# Altium footprint library THU VIEN PCB.PCBLib: 534 footprints (part 3 of 34)
Each footprint in its own frame and in the unit in brackets; x right, y up, seen from the top. Pads: shape width x height; smd on the part's side, far side on the other; paste and mask are expansions set on the pad; w line width, h text height; cw(c..) or ccw(c..) is an arc to the next point about the centre after c.
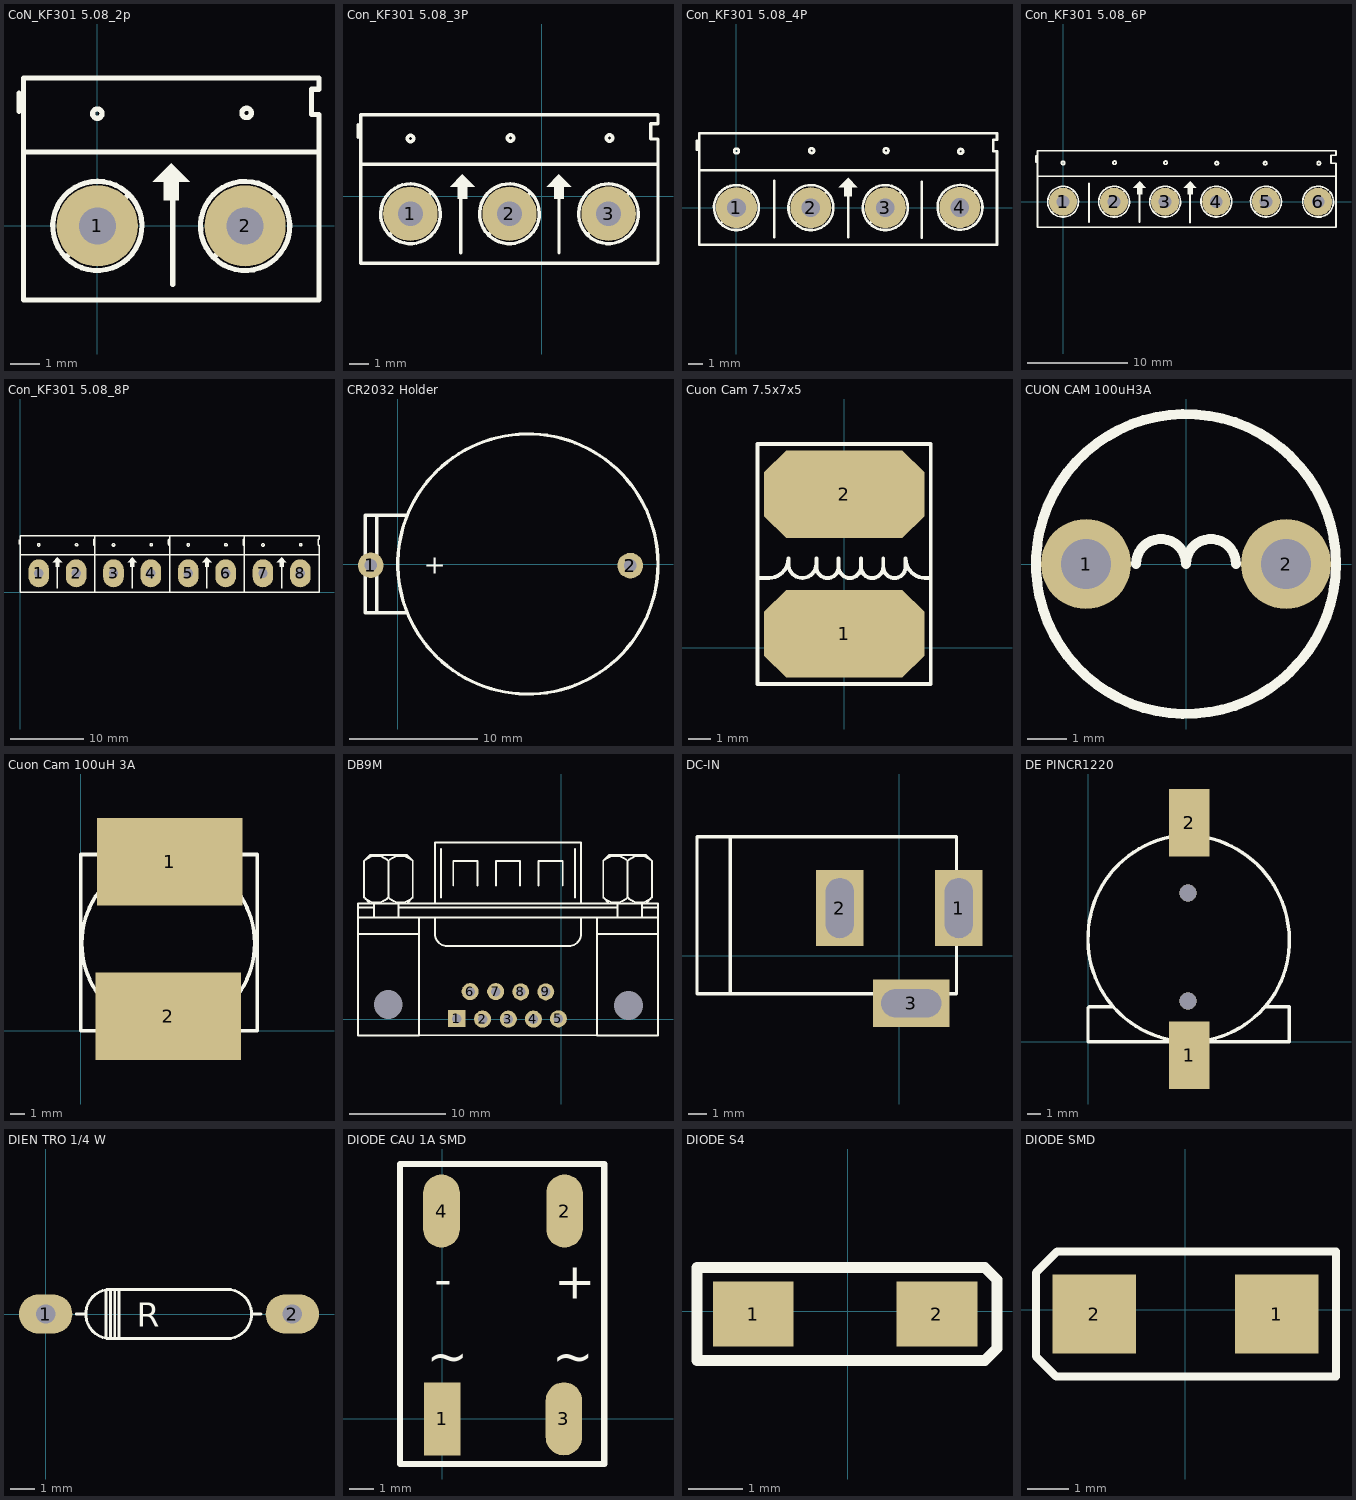
[diagram p2: the footprints below, top view; thin cyan lines are the x and y axes]

## CoN_KF301 5.08_2p [mil]
pads (2):
  round 110 hole 50: 1(0,0) 2(200,0)
Top Overlay:
  circle w7: c202,153 r6.4
  circle w7: c0,152 r6.4
  region: 100,85 75,60 90,60 90,35 110,35 110,60 125,60
  lines w7: -106,155 -106,180 ; -100,100 300,100 ; -42,-42 43,43 ; 39.04,46.05 ccw(c0,0) 45.18,40.05 ; 102,-79 102,72 ; 158,-42 242.5,42.5 ; 239.76,45.44 ccw(c200,0) 245.18,40.05 ; 290,182 290,151 300,151 300,-100 -100,-100 -100,50 -100,200 300,200 300,185 290,185 ; 300,-79 300,40
3D body "Con 2 KF301.stp": height 335.25, standoff -137.19, extent -45,-97.4 255,190

## Con_KF301 5.08_3P [mil]
pads (3):
  round 110 hole 50: 1(-265,-35) 2(-65,-35) 3(135.06,-34.94)
Top Overlay:
  circle w7: c137,118 r6.4
  circle w7: c-265,117 r6.4
  circle w7: c-63,118 r6.4
  region: -160,45 -185,20 -170,20 -170,-5 -150,-5 -150,20 -135,20
  region: 35,45 10,20 25,20 25,-5 45,-5 45,20 60,20
  lines w7: -371,120 -371,145 ; -365,65 230,65 ; -307,-77 -222,8 ; -225.96,11.05 ccw(c-265,-35) -219.82,5.05 ; -163,-114 -163,37 ; -107,-77 -22.5,7.5 ; -25.24,10.44 ccw(c-65,-35) -19.82,5.05 ; 35,-114 35,5 ; 93.5,-76.5 177.5,7.5 ; 174.27,10.97 ccw(c135.06,-34.94) 180.19,5.17 ; -365,-135 235,-135 235,116 220,116 220,147 235,147 235,165 -365,165 -365,15 -365,-135

## Con_KF301 5.08_4P [mil]
pads (4):
  round 110 hole 50: 1(0,0) 2(200,0) 3(400.06,0.06) 4(600.39,0.39)
Top Overlay:
  circle w7: c602.6,151 r6.4
  circle w7: c402,153 r6.4
  circle w7: c0,152 r6.4
  circle w7: c202,153 r6.4
  region: 300,80 275,55 290,55 290,30 310,30 310,55 325,55
  lines w7: -106,155 -106,180 ; -100,100 700,100 ; -42,-42 43,43 ; 39.04,46.05 ccw(c0,0) 45.18,40.05 ; 102,-79 102,72 ; 158,-42 242.5,42.5 ; 239.76,45.44 ccw(c200,0) 245.18,40.05 ; 300,-79 300,40 ; 358.5,-41.5 442.5,42.5 ; 439.27,45.97 ccw(c400.06,0.06) 445.19,40.17 ; 497.97,-81.03 497.97,69.97 ; 559,-41 643.5,43.5 ; 640.16,46.18 ccw(c600.59,0.59) 646.12,40.23 ; -100,-100 700,-100 700,151 690,151 690,182 700,182 700,200 -100,200 -100,50 -100,-100
3D body "terminal_blocks_a-tb500-ta04.stp": height 496.57, standoff -145.15, extent -115.51,-156 695.51,198.33

## Con_KF301 5.08_6P [mil]
pads (6):
  round 110 hole 50: 1(0,0) 2(200,0) 3(400.06,0.06) 4(600.39,0.39) 5(795.39,0.39) 6(1000,0)
Top Overlay:
  circle w7: c1002.6,151 r6.4
  circle w7: c792.6,151 r6.4
  circle w7: c202,153 r6.4
  circle w7: c0,152 r6.4
  circle w7: c402,153 r6.4
  circle w7: c602.6,151 r6.4
  region: 498,80 473,55 488,55 488,30 508,30 508,55 523,55
  region: 300,80 275,55 290,55 290,30 310,30 310,55 325,55
  lines w7: -106,155 -106,180 ; -100,100 1070,100 ; -42,-42 43,43 ; 39.04,46.05 ccw(c0,0) 45.18,40.05 ; 102,-79 102,72 ; 158,-42 242.5,42.5 ; 239.76,45.44 ccw(c200,0) 245.18,40.05 ; 300,-79 300,40 ; 358.5,-41.5 442.5,42.5 ; 439.27,45.97 ccw(c400.06,0.06) 445.19,40.17 ; 497.97,-81.03 497.97,69.97 ; 559,-41 643.5,43.5 ; 640.16,46.18 ccw(c600.59,0.59) 646.12,40.23 ; 754,-41 838.5,43.5 ; 835.16,46.18 ccw(c795.59,0.59) 841.12,40.23 ; 1039.57,45.6 ccw(c1000,0) 1045.53,39.65 ; -100,-100 -100,50 -100,200 1070,200 1070,182 1050,182 1050,151 1070,151 1070,-100 -100,-100
3D body "SW3dPS-KRM2.STEP": height 393.7, standoff -157.48, extent -96.85,-100 296.85,195.28
3D body "SW3dPS-KRM2.STEP": height 393.7, standoff -157.48, extent 293.15,-100 686.85,195.28
3D body "SW3dPS-KRM2.STEP": height 393.7, standoff -157.48, extent 683.15,-100 1076.85,195.28

## Con_KF301 5.08_8P [mm]
pads (8):
  oval 2.794x3.8 hole 1.27: 1(2.54,2.54) 2(7.62,2.54) 3(12.7,2.54) 4(17.78,2.54) 5(22.86,2.54) 6(27.94,2.54) 7(33.02,2.54) 8(38.1,2.54)
Top Overlay:
  circle w0.178: c33.02,6.401 r0.163
  circle w0.178: c38.151,6.426 r0.163
  circle w0.178: c27.991,6.426 r0.163
  circle w0.178: c22.86,6.401 r0.163
  circle w0.178: c17.831,6.426 r0.163
  circle w0.178: c12.7,6.401 r0.163
  circle w0.178: c7.671,6.426 r0.163
  circle w0.178: c2.54,6.401 r0.163
  region: 35.56,4.699 34.925,4.064 35.306,4.064 35.306,3.429 35.814,3.429 35.814,4.064 36.195,4.064
  region: 25.4,4.699 24.765,4.064 25.146,4.064 25.146,3.429 25.654,3.429 25.654,4.064 26.035,4.064
  region: 15.24,4.699 14.605,4.064 14.986,4.064 14.986,3.429 15.494,3.429 15.494,4.064 15.875,4.064
  region: 5.08,4.699 4.445,4.064 4.826,4.064 4.826,3.429 5.334,3.429 5.334,4.064 5.715,4.064
  lines w0.178: -0.152,6.477 -0.152,7.112 ; 0.051,5.08 10.135,5.08 ; 5.08,0.533 5.08,4.369 ; 10.008,6.477 10.008,7.112 ; 10.211,5.08 20.295,5.08 ; 15.24,0.533 15.24,4.369 ; 20.168,6.477 20.168,7.112 ; 20.371,5.08 30.455,5.08 ; 25.4,0.533 25.4,4.369 ; 30.328,6.477 30.328,7.112 ; 30.531,5.08 40.615,5.08 ; 35.56,0.533 35.56,4.369 ; 10.16,0 10.16,3.81 10.16,7.62 ; 10.16,0 20.32,0 ; 10.16,0 10.16,6.375 10.033,6.375 10.033,7.163 10.16,7.163 10.16,7.62 ; 10.16,0 0,0 0,3.81 0,7.62 10.16,7.62 ; 10.16,7.62 20.32,7.62 ; 20.32,0 20.32,3.81 20.32,7.62 ; 20.32,0 30.48,0 ; 20.32,0 20.32,6.375 20.193,6.375 20.193,7.163 20.32,7.163 20.32,7.62 ; 20.32,7.62 30.48,7.62 ; 30.48,0 40.64,0 40.64,6.375 40.513,6.375 40.513,7.163 40.64,7.163 40.64,7.62 30.48,7.62 ; 30.48,0 30.48,3.81 30.48,7.62 ; 30.48,0 30.48,6.375 30.353,6.375 30.353,7.163 30.48,7.163 30.48,7.62
3D body "SW3dPS-KRM2.STEP": height 10, standoff -4, extent 30.56,0.06 40.56,7.56
3D body "SW3dPS-KRM2.STEP": height 10, standoff -4, extent 20.4,0.06 30.4,7.56
3D body "SW3dPS-KRM2.STEP": height 10, standoff -4, extent 10.24,0.06 20.24,7.56
3D body "SW3dPS-KRM2.STEP": height 10, standoff -4, extent 0.08,0.06 10.08,7.56

## CR2032 Holder [mm]
pads (2):
  round 2 hole 1: 1(-2.108,-0.102) 2(18.161,-0.127)
Top Overlay:
  circle w0.254: c10.16,0 r10.161
  lines w0.254: -1.651,-3.81 -1.651,3.81 ; 0.635,-3.81 -2.54,-3.81 -2.54,3.81 0.635,3.81
  text "+" at 2.032,-0.762 h1.52
3D body "CR2032_HOR_HOLD.step": height 8.52, standoff -3.98, extent -3.213,-11.076 21.287,10.924

## Cuon Cam 7.5x7x5 [mm]
pads (2):
  oct 7.3x4 smd: 1(0,0.635) 2(0,6.985)
Top Overlay:
  lines w0.178: -3.937,3.175 -3.429,3.175 ccw(c-3.429,4.064) -2.54,4.064 -2.54,3.81 ccw(c-1.905,3.81) -1.905,3.175 ccw(c-1.905,3.81) -1.27,3.81 -1.27,4.064 -1.27,3.683 ccw(c-0.762,3.683) -0.762,3.175 ccw(c-0.762,3.683) -0.254,3.683 ; 3.937,3.175 3.683,3.175 cw(c3.683,4.064) 2.794,4.064 2.794,3.683 cw(c2.286,3.683) 2.286,3.175 cw(c2.286,3.683) 1.778,3.683 ; -0.254,3.683 ccw(c0.254,3.683) 0.254,3.175 ccw(c0.254,3.683) 0.762,3.683 ; -0.254,3.683 -0.254,4.064 -0.254,3.683 ; 0.762,3.683 ccw(c1.27,3.683) 1.27,3.175 ccw(c1.27,3.683) 1.778,3.683 ; 0.762,3.683 0.762,4.064 0.762,3.683 ; 1.778,3.683 1.778,4.064 1.778,3.683 ; -3.937,-1.651 -3.937,9.271 3.937,9.271 3.937,-1.651 -3.937,-1.651
3D body "cuon cam 75.step": height 5.02, standoff 0.01, extent -3.5,0.069 3.5,7.805

## CUON CAM 100uH3A [mil] "100uH3A"
pads (2):
  round 90 hole 50: 1(-100,0) 2(100,0)
Top Overlay:
  circle w10: c0,0 r150
  lines w10: -50,0 cw(c-25,0) 0,0 cw(c25,0) 50,0
3D body "cuon cam cam 1A.step": height 394.18, standoff -196.37, extent -171.27,-175.26 171.25,167.26

## Cuon Cam 100uH 3A [mm]
pads (2):
  rect 10x6 smd: 1(6.1,11.6) 2(6,1)
Top Overlay:
  circle w0.254: c6,6 r5.941
  lines w0.254: 0,0 0,12.1 12.1,12.1 12.1,9.2 12.1,0 0,0
3D body "CUON CAM CDRH127 3A SMD.step": height 7.51, standoff 0.06, extent 0.096,-0.202 12.096,12.14

## DB9M [mil]
pads (11):
  rect 70x70 hole 39.37 unplated: 1(-429,2)
  round 70 hole 39.37 unplated: 2(-323,0) 3(-217,0) 4(-114,0) 5(-11,1) 6(-374,113) 7(-269,113) 8(-166,112) 9(-63,112)
  round 70 hole 118.11 unplated: ""(-711,60) ""(277,56)
Top Overlay:
  lines w7.87: -619,-66.67 210,-66.67
  lines w8: -835,350 -585,350 ; -835,416.67 398.33,416.67 ; -835,458.33 -768.33,458.33 ; -810.09,499.91 ccw(c-760,550) -709.91,499.91 ; -810.09,650.09 cw(c-760,600) -709.91,650.09 ; -785,475 -810,500 -810,650 -785,675 -635,675 -610,650 -610,500 -635,475 ; -768.33,416.67 -768.33,475 ; -710.09,499.91 ccw(c-660,550) -609.91,499.91 ; -710.09,650.09 cw(c-660,600) -609.91,650.09 ; -710,500 -710,650 ; -668.33,416.67 -668.33,475 ; -668.33,458.33 231.67,458.33 ; -585,416.67 -585,-66.67 -835,-66.67 -835,475 398.33,475 398.33,-66.67 148.33,-66.67 148.33,416.67 ; -518.33,416.67 -518.33,350 ccw(c-468.33,350) -468.33,300 31.67,300 ccw(c31.67,350) 81.67,350 81.67,416.67 ; -518.33,475 -518.33,725 81.67,725 81.67,475 ; -493.33,500 -493.33,700 ; -443.33,550 -443.33,650 -343.33,650 -343.33,550 ; -268.33,550 -268.33,650 -168.33,650 -168.33,550 ; -93.33,550 -93.33,650 6.67,650 6.67,550 ; 56.67,500 56.67,700 ; 148.33,350 398.33,350 ; 173.25,499.91 ccw(c223.33,550) 273.42,499.91 ; 173.25,650.09 cw(c223.33,600) 273.42,650.09 ; 198.33,475 173.33,500 173.33,650 198.33,675 348.33,675 373.33,650 373.33,500 348.33,475 ; 231.67,416.67 231.67,475 ; 273.25,499.91 ccw(c323.33,550) 373.42,499.91 ; 273.25,650.09 cw(c323.33,600) 373.42,650.09 ; 273.33,500 273.33,650 ; 331.67,416.67 331.67,475 ; 331.67,458.33 398.33,458.33
3D body "DB9.step": height 447.45, standoff -199.2, extent -824.3,-61 388.3,663.41

## DC-IN [mm] "Jac DC input"
height 5.08
pads (3):
  rect 2.54x4.064 hole 1.5 slot 3.2 at 90 deg: 1(3.175,2.54) 2(-3.175,2.54)
  rect 4.064x2.54 hole 1.5 slot 3.2 at 0 deg: 3(0.635,-2.54)
Top Overlay:
  lines w0.178: -9.017,-2.032 -9.017,6.35 ; -10.795,-2.032 3.048,-2.032 3.048,6.35 -10.795,6.35 -10.795,-2.032
3D body "SW3dPS-dc range - dc connector[4840.2201].STEP": height 11.02, standoff -3.48, extent -10.423,-2.67 3.404,6.836

## DE PINCR1220 [mm]
pads (2):
  rect 3x5 smd: 1(7.5,-1) 2(7.5,16.2)
via 7.4,11 diameter 1.27 hole 1.27
via 7.4,3 diameter 1.27 hole 1.27
Top Overlay:
  lines w0.254: 0,2.5 0,0 14.9,0 ; 0.1,2.6 1.8,2.6 ; 7,15.3 cw(c7.1,7.5) 14.9,7.6 cw(c7.45,7.45) 7.6,0 cw(c7.55,7.55) 0,7.5 cw(c7.6,7.7) 7.4,15.3 ; 13.1,2.6 14.9,2.6 14.9,0 ; 14.9,0.1 14.9,2.5 ; 14.9,0.2 14.9,0
3D body "CR1220 SMD.STEP": height 4.76, standoff 0.01, extent 0.042,-2.819 14.791,15.981

## DIEN TRO 1/4 W [mm]
pads (2):
  oval 2.2x1.6 hole 0.787: 1(0,0) 2(10.16,0)
Top Overlay:
  lines w0.12: 1.257,0 1.651,0 ; 2.489,-0.978 2.489,0.978 ; 2.591,1.016 7.468,1.016 cw(c7.468,0) 7.468,-1.016 2.667,-1.016 cw(c2.667,0) 2.667,1.016 ; 2.68,-1.016 2.667,-1.003 2.667,1.003 2.68,1.016 ; 2.845,-1.016 2.845,1.016 ; 3.023,-1.003 3.023,0.991 ; 8.484,0 8.877,0
  text "R" at 3.746,-0.521 h1
3D body "SW3dPS-RESISTOR, 0.25 W, 0.4 IN LEAD PITCH.STEP": height 2.93, standoff -2.54, extent -0.305,-1.156 10.465,1.156

## DIODE CAU 1A SMD [mm]
pads (4):
  rect 1.5x3 smd: 1(0,0)
  oval 1.5x3 smd: 2(5.029,8.534) 3(5,0) 4(-0.025,8.534)
Top Overlay:
  lines w0.254: -1.727,-1.854 6.655,-1.854 6.655,10.465 -1.727,10.465 -1.727,-1.854
  text "~" at -0.635,1.372 h2.54
  text "~" at 4.521,1.372 h2.54
  text "+" at 4.597,4.445 h2.54
  text "-" at -0.33,4.572 h2.54
3D body "User Library-SDIP-1.step": height 2.93, standoff 0, extent -1.744,-0.809 6.756,9.191

## DIODE S4 [mm]
pads (2):
  rect 1.5x1.2 smd: 1(-1.751,-0.051) 2(1.652,-0.051)
Top Overlay:
  lines w0.2: -2.794,-0.914 2.54,-0.914 2.769,-0.686 2.769,0.584 2.54,0.813 -2.794,0.813 -2.794,-0.914
3D body "Diode-SOD12.step": height 1.18, standoff 0, extent -2.001,-0.951 1.899,0.849

## DIODE SMD [mm]
pads (2):
  rect 2x1.9 smd: 1(2.184,-0.102) 2(-2.184,-0.102)
Top Overlay:
  lines w0.2: -3.581,-1.118 -3.099,-1.6 3.607,-1.6 3.607,1.397 -3.073,1.397 -3.581,0.889 -3.581,-0.344 -3.581,-1.118
3D body "SMB.STEP": height 2.3, standoff 0.02, extent -2.667,-1.498 2.82,1.296